# Altium footprint library Library 3D.PcbLib: 288 footprints (part 17 of 18)
Each footprint in its own frame and in the unit in brackets; x right, y up, seen from the top. Pads: shape width x height; smd on the part's side, far side on the other; paste and mask are expansions set on the pad; w line width, h text height; cw(c..) or ccw(c..) is an arc to the next point about the centre after c.
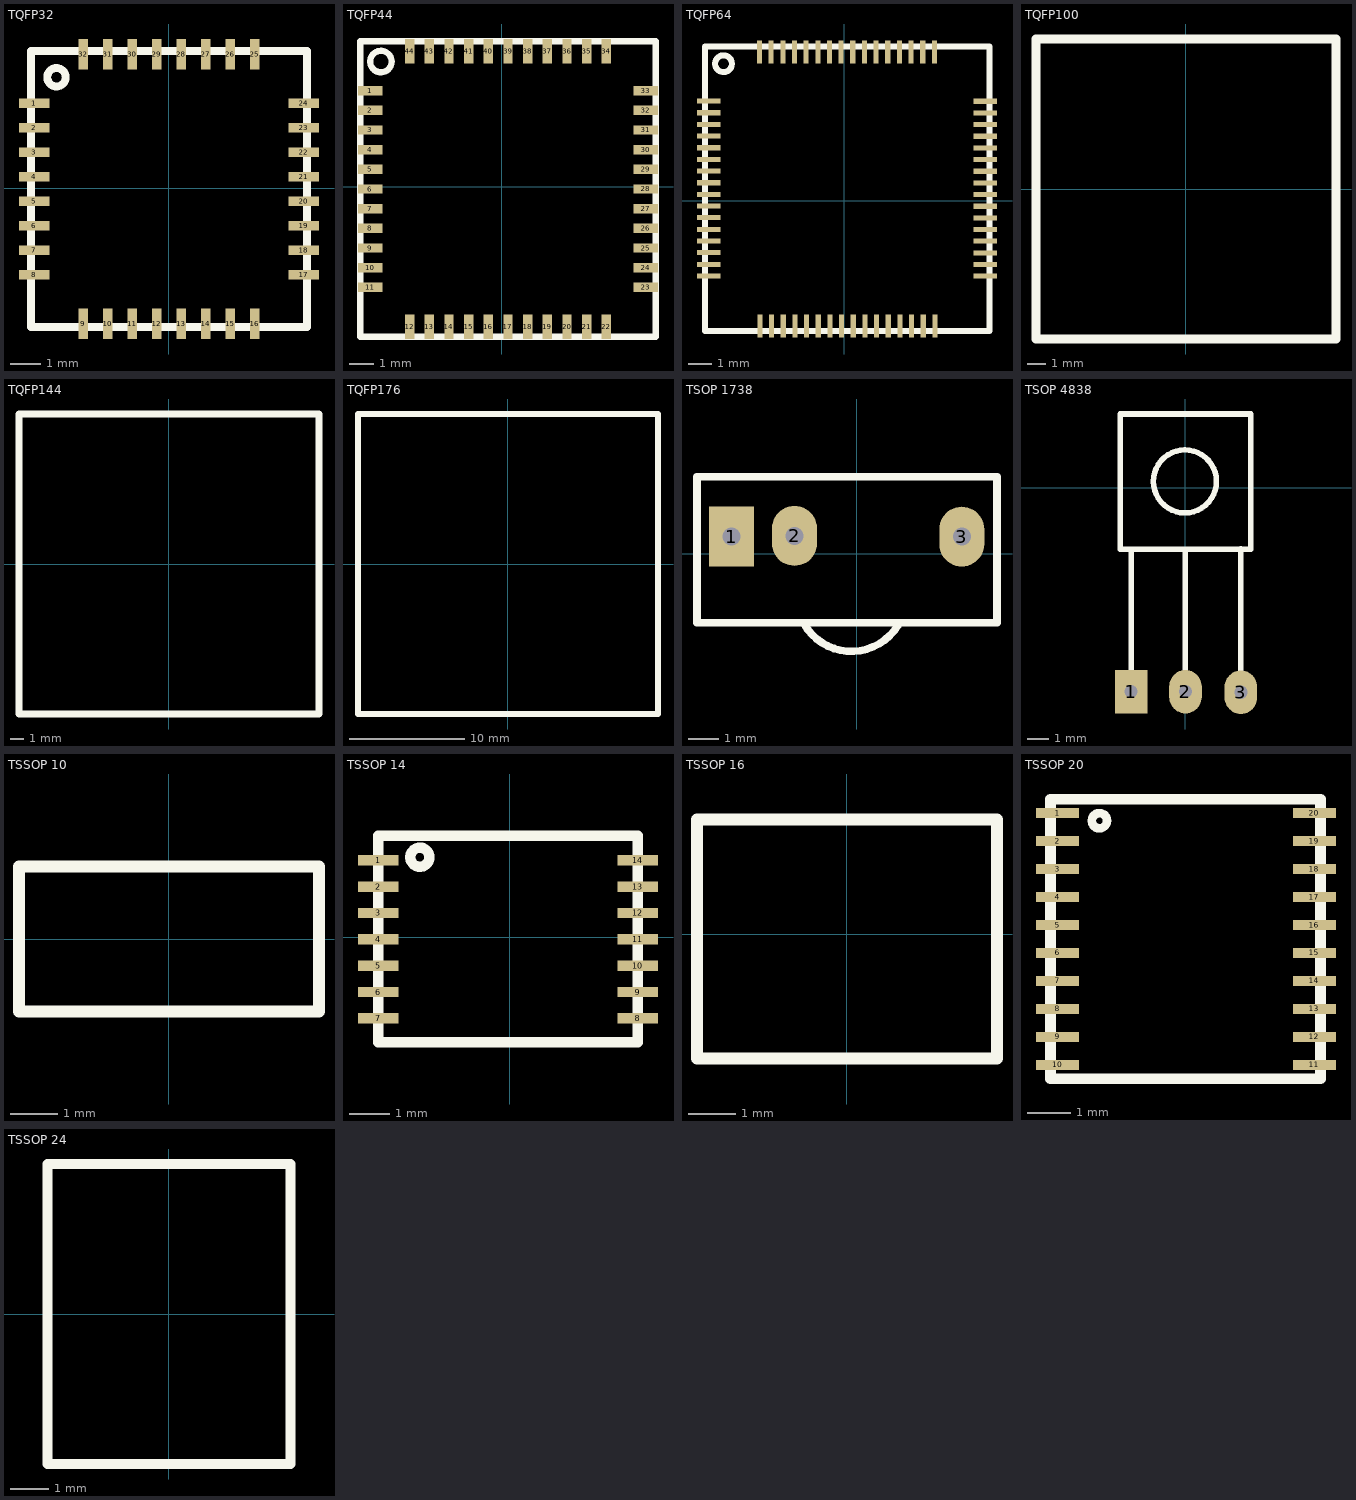
[diagram p16: the footprints below, top view; thin cyan lines are the x and y axes]

## TQFP32 [mm]
pads (32):
  rect 1x0.3 smd: 1(-4.4,2.775) 2(-4.4,1.975) 3(-4.4,1.175) 4(-4.4,0.375) 5(-4.4,-0.425) 6(-4.4,-1.225) 7(-4.4,-2.025) 8(-4.4,-2.825) 17(4.4,-2.825) 18(4.4,-2.025) 19(4.4,-1.225) 20(4.4,-0.425) 21(4.4,0.375) 22(4.4,1.175) 23(4.4,1.975) 24(4.4,2.775)
  rect 0.3x1 smd: 9(-2.8,-4.425) 10(-2,-4.425) 11(-1.2,-4.425) 12(-0.4,-4.425) 13(0.4,-4.425) 14(1.2,-4.425) 15(2,-4.425) 16(2.8,-4.425) 25(2.8,4.375) 26(2,4.375) 27(1.2,4.375) 28(0.4,4.375) 29(-0.4,4.375) 30(-1.2,4.375) 31(-2,4.375) 32(-2.8,4.375)
Top Overlay:
  circle w0.254: c-3.675,3.625 r0.301
  lines w0.254: -4.509,-4.534 4.509,-4.534 4.509,4.484 -4.509,4.484 -4.509,-4.534
3D body "User Library-TQFP32-1.STEP": height 1.1, standoff 0, extent -4.509,-4.534 4.509,4.484

## TQFP44 [mm]
pads (44):
  rect 1x0.38 smd: 1(-5.35,3.9) 2(-5.35,3.1) 3(-5.35,2.3) 4(-5.35,1.5) 5(-5.35,0.7) 6(-5.35,-0.1) 7(-5.35,-0.9) 8(-5.35,-1.7) 9(-5.35,-2.5) 10(-5.35,-3.3) 11(-5.35,-4.1) 23(5.85,-4.1) 24(5.85,-3.3) 25(5.85,-2.5) 26(5.85,-1.7) 27(5.85,-0.9) 28(5.85,-0.1) 29(5.85,0.7) 30(5.85,1.5) 31(5.85,2.3) 32(5.85,3.1) 33(5.85,3.9)
  rect 0.38x1 smd: 12(-3.75,-5.7) 13(-2.95,-5.7) 14(-2.15,-5.7) 15(-1.35,-5.7) 16(-0.55,-5.7) 17(0.25,-5.7) 18(1.05,-5.7) 19(1.85,-5.7) 20(2.65,-5.7) 21(3.45,-5.7) 22(4.25,-5.7) 34(4.25,5.5) 35(3.45,5.5) 36(2.65,5.5) 37(1.85,5.5) 38(1.05,5.5) 39(0.25,5.5) 40(-0.55,5.5) 41(-1.35,5.5) 42(-2.15,5.5) 43(-2.95,5.5) 44(-3.75,5.5)
Top Overlay:
  circle w0.254: c-4.919,5.082 r0.437
  lines w0.254: -5.759,-6.109 -5.759,5.909 6.259,5.909 6.259,-6.109 -5.759,-6.109
3D body "User Library-TQFP44.STEP": height 1.13, standoff 0.06, extent -5.75,-6.091 6.25,5.909

## TQFP48 [mm]

## TQFP64 [mm]
pads (64):
  rect 1x0.22 smd: 1(-5.817,4.267) 2(-5.817,3.767) 3(-5.817,3.267) 4(-5.817,2.767) 5(-5.817,2.267) 6(-5.817,1.767) 7(-5.817,1.267) 8(-5.817,0.767) 9(-5.817,0.267) 10(-5.817,-0.233) 11(-5.817,-0.733) 12(-5.817,-1.233) 13(-5.817,-1.733) 14(-5.817,-2.233) 15(-5.817,-2.733) 16(-5.817,-3.233) 33(6.045,-3.24) 34(6.045,-2.74) 35(6.045,-2.24) 36(6.045,-1.74) 37(6.045,-1.24) 38(6.045,-0.74) 39(6.045,-0.24) 40(6.045,0.26) 41(6.045,0.76) 42(6.045,1.26) 43(6.045,1.76) 44(6.045,2.26) 45(6.045,2.76) 46(6.045,3.26) 47(6.045,3.76) 48(6.045,4.26)
  rect 0.22x1 smd: 17(-3.619,-5.38) 18(-3.119,-5.38) 19(-2.619,-5.38) 20(-2.119,-5.38) 21(-1.619,-5.38) 22(-1.119,-5.38) 23(-0.619,-5.38) 24(-0.119,-5.38) 25(0.381,-5.38) 26(0.881,-5.38) 27(1.381,-5.38) 28(1.881,-5.38) 29(2.381,-5.38) 30(2.881,-5.38) 31(3.381,-5.38) 32(3.881,-5.38) 49(3.864,6.373) 50(3.364,6.373) 51(2.864,6.373) 52(2.364,6.373) 53(1.864,6.373) 54(1.364,6.373) 55(0.864,6.373) 56(0.364,6.373) 57(-0.136,6.373) 58(-0.636,6.373) 59(-1.136,6.373) 60(-1.636,6.373) 61(-2.136,6.373) 62(-2.636,6.373) 63(-3.136,6.373) 64(-3.636,6.373)
Top Overlay:
  circle w0.254: c-5.182,5.867 r0.361
  lines w0.254: -5.977,-5.596 6.223,-5.596 6.223,6.604 -5.977,6.604 -5.977,-5.596
3D body "User Library-TQFP64-2.STEP": height 1.18, standoff -0.02, extent -5.977,-5.596 6.223,6.604

## TQFP100 [mm]
Top Overlay:
  lines w0.5: -8.009,-8.009 -8.009,8.009 8.009,8.009 8.009,-8.009 -8.009,-8.009
3D body "User Library-TQFP100-2.STEP": height 1.1, standoff 0, extent -8.009,-8.009 8.009,8.009

## TQFP144 [mm]
Top Overlay:
  lines w0.5: -11.009,-11.008 -11.009,11.009 11.009,11.009 11.009,-11.008 -11.009,-11.008
3D body "User Library-TQFP144.STEP": height 1.1, standoff 0, extent -11.009,-11.008 11.009,11.009

## TQFP176 [mm]
Top Overlay:
  lines w0.5: -13.009,-13.009 -13.009,13.009 13.009,13.009 13.009,-13.009 -13.009,-13.009
3D body "User Library-TQFP176.STEP": height 1.1, standoff 0, extent -13.009,-13.009 13.009,13.009

## TSOP 1738 [mm]
pads (3):
  rect 1.5x2 hole 0.6: 1(-4.175,0.575)
  oval 1.5x2 hole 0.6: 2(-2.075,0.6) 3(3.5,0.575)
Top Overlay:
  lines w0.254: -1.767,-2.318 ccw(c-0.179,-1.431) 1.375,-2.375 ; -5.325,-2.3 4.675,-2.3 4.675,2.575 -5.325,2.575 -5.325,-2.3
3D body "User Library-tsop1738.STEP": height 20.5, standoff -10.1, extent -5.325,-3.225 4.675,2.575

## TSOP 4838 [mm]
pads (3):
  rect 1.5x2 hole 0.6: 1(-2.5,-9.375)
  oval 1.5x2 hole 0.6: 2(0,-9.375) 3(2.55,-9.4)
Top Overlay:
  circle w0.254: c-0.025,0.3 r1.45
  lines w0.254: -3,-2.825 -3,3.4 3,3.4 3,-2.825 0.2,-2.825 -2.95,-2.825 ; -2.5,-9.375 -2.5,-2.925 ; 0,-9.375 0,-2.825 ; 2.55,-9.4 2.55,-2.8
3D body "User Library-IR reciver.STEP": height 5.22, standoff -2.57, extent -3,-9.63 3,3.475

## TSSOP 6 [mm]
3D body "User Library-TSSOP-6 (SOT-23-6 PITCH 0_65).STEP": height 1.15, standoff 0.04, extent -1.125,-1.125 1.125,1.125

## TSSOP 8 [mm]
3D body "User Library-TSSOP-8 3_1x4_4.STEP": height 0.5, standoff -0.6, extent -3.2,-1.55 3.2,1.55

## TSSOP 10 [mm]
Top Overlay:
  lines w0.254: -3.2,-1.55 -3.2,1.55 3.2,1.55 3.2,-1.55 -3.2,-1.55
3D body "User Library-TSSOP-10 3_1x4_4.STEP": height 0.5, standoff -0.6, extent -3.2,-1.55 3.2,1.55

## TSSOP 14 [mm]
pads (14):
  rect 1x0.254 smd: 1(-3.246,1.9) 2(-3.246,1.25) 3(-3.246,0.6) 4(-3.246,-0.05) 5(-3.246,-0.7) 6(-3.246,-1.35) 7(-3.246,-2) 8(3.154,-2) 9(3.154,-1.35) 10(3.154,-0.7) 11(3.154,-0.05) 12(3.154,0.6) 13(3.154,1.25) 14(3.154,1.9)
Top Overlay:
  circle w0.254: c-2.221,1.975 r0.236
  lines w0.254: -3.246,-2.592 -3.246,2.508 3.154,2.508 3.154,-2.592 -3.246,-2.592
3D body "User Library-TSSOP-14 5_1x4_4.STEP": height 1.08, standoff -0.02, extent -3.246,-2.592 3.154,2.508

## TSSOP 16 [mm]
Top Overlay:
  lines w0.254: -3.2,-2.65 3.2,-2.65 3.2,2.45 -3.2,2.45 -3.2,-2.65
3D body "User Library-TSSOP-16 5_1x4_4.STEP": height 0.5, standoff -0.6, extent -3.2,-2.65 3.2,2.45

## TSSOP 20 [mm]
pads (20):
  rect 1x0.23 smd: 1(-1266.975,-1262.95) 2(-1266.975,-1263.6) 3(-1266.975,-1264.25) 4(-1266.975,-1264.9) 5(-1266.975,-1265.55) 6(-1266.975,-1266.2) 7(-1266.975,-1266.85) 8(-1266.975,-1267.5) 9(-1266.975,-1268.15) 10(-1266.975,-1268.8) 11(-1261,-1268.8) 12(-1261,-1268.15) 13(-1261,-1267.5) 14(-1261,-1266.85) 15(-1261,-1266.2) 16(-1261,-1265.55) 17(-1261,-1264.9) 18(-1261,-1264.25) 19(-1261,-1263.6) 20(-1261,-1262.95)
Top Overlay:
  circle w0.2: c-1266,-1263.125 r0.177
  lines w0.254: -1267.14,-1269.125 -1260.86,-1269.125 -1260.86,-1262.625 -1267.14,-1262.625 -1267.14,-1269.125
3D body "User Library-TSSOP20-1.STEP": height 1.09, standoff 0, extent -1267.14,-1269.125 -1260.86,-1262.625

## TSSOP 24 [mm]
Top Overlay:
  lines w0.254: -3.2,-3.95 -3.2,3.95 3.2,3.95 3.2,-3.95 -3.2,-3.95
3D body "User Library-TSSOP-24 7_9x4_4.STEP": height 0.5, standoff -0.6, extent -3.2,-3.95 3.2,3.95